# Altium footprint library THD_2LEAD.PCBLIB: 53 footprints (part 4 of 4)
Each footprint in its own frame and in the unit in brackets; x right, y up, seen from the top. Pads: shape width x height; smd on the part's side, far side on the other; paste and mask are expansions set on the pad; w line width, h text height; cw(c..) or ccw(c..) is an arc to the next point about the centre after c.
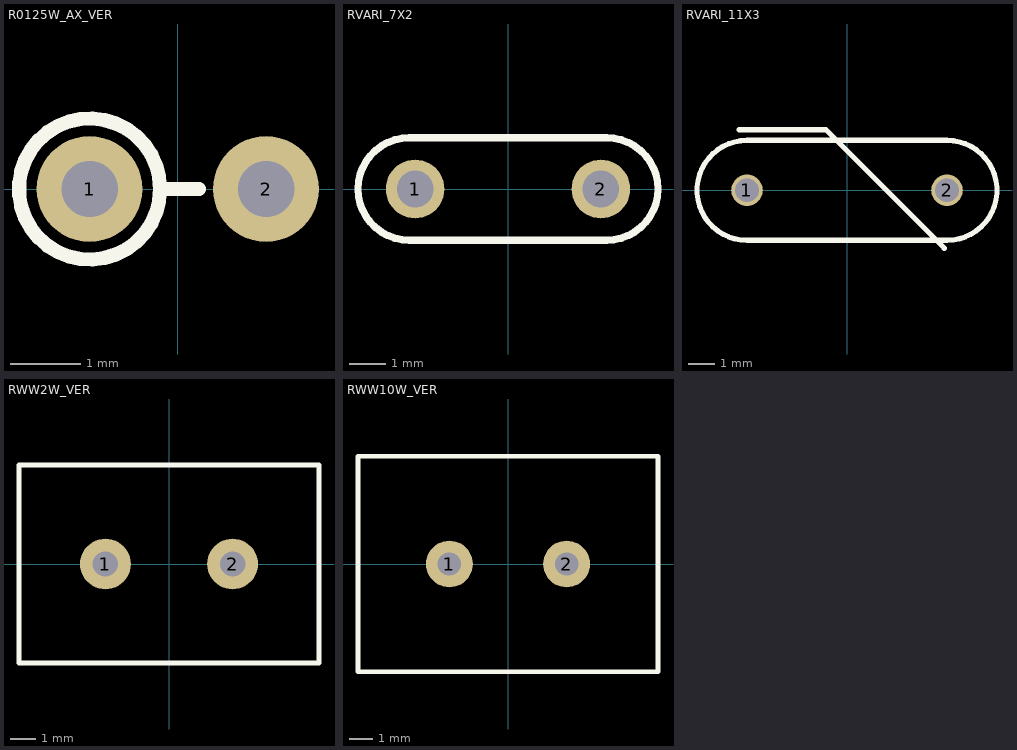
[diagram p3: the footprints below, top view; thin cyan lines are the x and y axes]

## R0125W_AX_VER [mm] "RESISTOR 1/8 WATT, AXIAL0.25"
pads (2):
  round 1.5 hole 0.8: 1(-1.25,0) 2(1.25,0)
TopOverlay:
  circle w0.2: c-1.25,0 r1
  lines w0.2: -0.25,0 0.3,0
3D body "User Library-RESAD250W50L320D180_0_125W.STEP": height 6.65, standoff -2.6, extent -2.15,-0.9 1.5,0.9

## RVARI_7X2 [mm] "R_VARISTOR, 7.0X2.5mm, pitch: 5.0mm, 275VAC(RMS)"
pads (2):
  round 1.6 / inner round 1.6 / far side oval 1.6x2.4 hole 1: 1(-2.54,0) 2(2.54,0)
TopOverlay:
  lines w0.2: -2.7,-1.4 cw(c-2.7,0) -2.7,1.4 2.7,1.4 cw(c2.7,0) 2.7,-1.4 -2.7,-1.4
3D body "User Library-Warystor_5mm.step": height 10.5, standoff -2.07, extent -4,-1.26 4,1.25

## RVARI_11X3 [mm] "R_VARISTOR, 11.0X3.5mm, pitch: 7.6mm,"
pads (2):
  round 1.2 / inner round 1.2 / far side oval 1.6x2 hole 0.9: 1(-3.8,0) 2(3.8,0)
TopOverlay:
  lines w0.2: -4.1,2.3 -0.8,2.3 3.7,-2.2 ; -3.8,-1.9 cw(c-3.8,0) -3.8,1.9 3.8,1.9 cw(c3.8,0) 3.8,-1.9 -3.8,-1.9
3D body "JVR10N331k_vertical.STEP": height 12, standoff -2.5, extent -5.497,-1.736 5.498,1.778

## RWW2W_VER [mm] "RESISTOR 2 WATT, Wirewound"
pads (2):
  round 2 hole 1: 1(-2.5,0) 2(2.5,0)
TopOverlay:
  lines w0.2: -5.9,-3.9 5.9,-3.9 5.9,3.9 -5.9,3.9 -5.9,-3.9
3D body "User Library-Cement Power Resistor SQM-02 2W 4R3.step": height 20.5, standoff -5, extent -5.75,-3.75 5.75,3.75

## RWW10W_VER [mm] "RESISTOR 10 WATT, Wirewound"
pads (2):
  round 2 hole 1: 1(-2.5,0) 2(2.5,0)
TopOverlay:
  lines w0.2: -6.4,-4.6 6.4,-4.6 6.4,4.6 -6.4,4.6 -6.4,-4.6
3D body "User Library-Cement Power Resistor SQM-10 10W R10.step": height 51, standoff -5, extent -6.25,-4.5 6.25,4.5